# Altium footprint library ADNB95C.PcbLib: 249 footprints (part 10 of 16)
Each footprint in its own frame and in the unit in brackets; x right, y up, seen from the top. Pads: shape width x height; smd on the part's side, far side on the other; paste and mask are expansions set on the pad; w line width, h text height; cw(c..) or ccw(c..) is an arc to the next point about the centre after c.
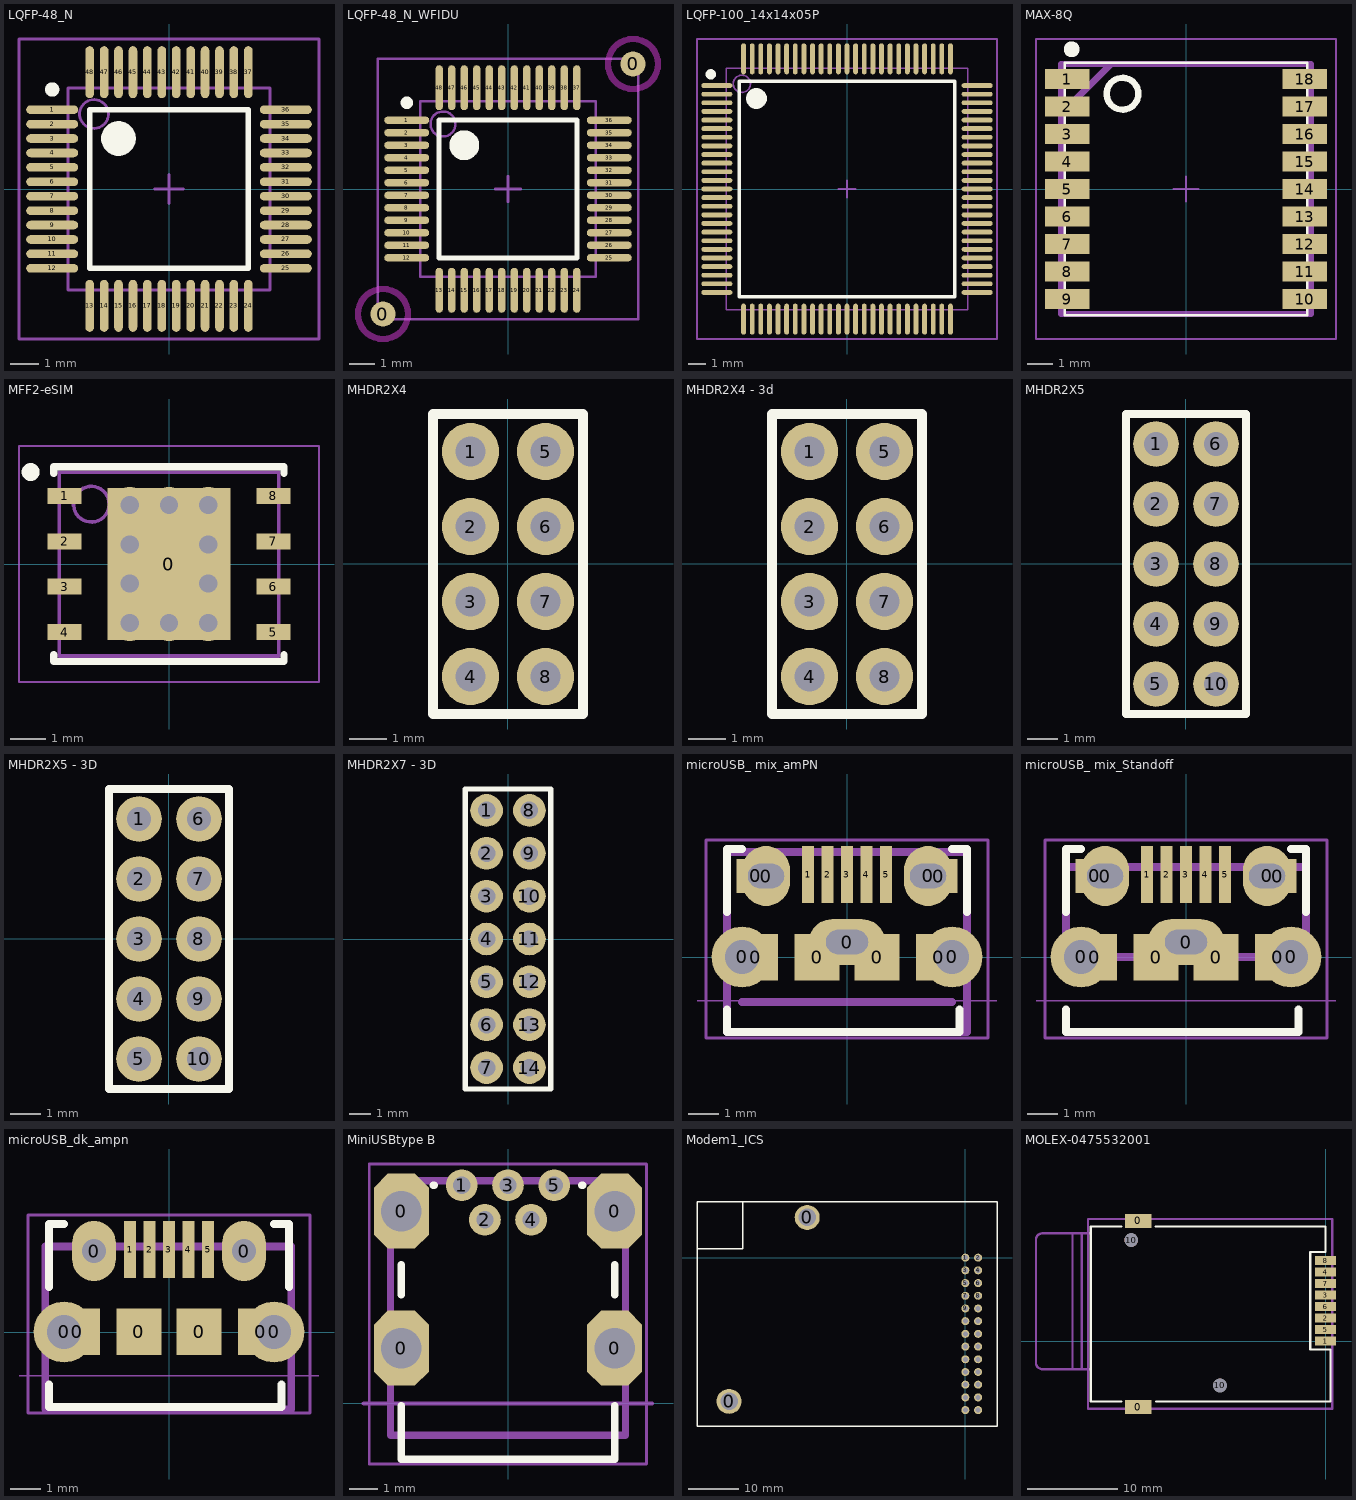
[diagram p9: the footprints below, top view; thin cyan lines are the x and y axes]

## LQFP-48_N [mm] "Thin QFP, 48-Leads, Body 7x7mm, Pitch 0.5mm, IPC Medium Density"
height 1.6
pads (48):
  oval 1.8x0.3 smd: 1(-4.05,2.75) 2(-4.05,2.25) 3(-4.05,1.75) 4(-4.05,1.25) 5(-4.05,0.75) 6(-4.05,0.25) 7(-4.05,-0.25) 8(-4.05,-0.75) 9(-4.05,-1.25) 10(-4.05,-1.75) 11(-4.05,-2.25) 12(-4.05,-2.75) 25(4.05,-2.75) 26(4.05,-2.25) 27(4.05,-1.75) 28(4.05,-1.25) 29(4.05,-0.75) 30(4.05,-0.25) 31(4.05,0.25) 32(4.05,0.75) 33(4.05,1.25) 34(4.05,1.75) 35(4.05,2.25) 36(4.05,2.75)
  oval 0.3x1.8 smd: 13(-2.75,-4.05) 14(-2.25,-4.05) 15(-1.75,-4.05) 16(-1.25,-4.05) 17(-0.75,-4.05) 18(-0.25,-4.05) 19(0.25,-4.05) 20(0.75,-4.05) 21(1.25,-4.05) 22(1.75,-4.05) 23(2.25,-4.05) 24(2.75,-4.05) 37(2.75,4.05) 38(2.25,4.05) 39(1.75,4.05) 40(1.25,4.05) 41(0.75,4.05) 42(0.25,4.05) 43(-0.25,4.05) 44(-0.75,4.05) 45(-1.25,4.05) 46(-1.75,4.05) 47(-2.25,4.05) 48(-2.75,4.05)
Top Overlay:
  circle w0.6: c-1.75,1.75 r0.3
  circle w0.25: c-4.05,3.45 r0.125
  lines w0.2: -2.75,-2.75 2.75,-2.75 2.75,2.75 -2.75,2.75 -2.75,-2.75
Top Designator (Mech7):
  text ".Designator" at -7.618,-0.508 h1.52
Top Assembly:
  circle w0.1: c-2.6,2.6 r0.5
  lines w0.1: -3.5,-3.5 3.5,-3.5 3.5,3.5 -3.5,3.5 -3.5,-3.5
Top Courtyard:
  lines w0.1: -0.5,0 0.5,0 ; 0,-0.5 0,0.5 ; -5.2,-5.2 5.2,-5.2 5.2,5.2 -5.2,5.2 -5.2,-5.2
3D body "SW3dPS-P-LQFP48-7x7-0.50.STEP": height 1.46, standoff 0.01, extent -4.5,-4.5 4.5,4.5

## LQFP-48_N_WFIDU [mm] "Thin QFP, 48-Leads, Body 7x7mm, Pitch 0.5mm, IPC Medium Density"
height 1.6
pads (50):
  round 1 smd paste-10 mask+0.5: 0(-5,-5) 0(5,5)
  oval 1.8x0.3 smd: 1(-4.05,2.75) 2(-4.05,2.25) 3(-4.05,1.75) 4(-4.05,1.25) 5(-4.05,0.75) 6(-4.05,0.25) 7(-4.05,-0.25) 8(-4.05,-0.75) 9(-4.05,-1.25) 10(-4.05,-1.75) 11(-4.05,-2.25) 12(-4.05,-2.75) 25(4.05,-2.75) 26(4.05,-2.25) 27(4.05,-1.75) 28(4.05,-1.25) 29(4.05,-0.75) 30(4.05,-0.25) 31(4.05,0.25) 32(4.05,0.75) 33(4.05,1.25) 34(4.05,1.75) 35(4.05,2.25) 36(4.05,2.75)
  oval 0.3x1.8 smd: 13(-2.75,-4.05) 14(-2.25,-4.05) 15(-1.75,-4.05) 16(-1.25,-4.05) 17(-0.75,-4.05) 18(-0.25,-4.05) 19(0.25,-4.05) 20(0.75,-4.05) 21(1.25,-4.05) 22(1.75,-4.05) 23(2.25,-4.05) 24(2.75,-4.05) 37(2.75,4.05) 38(2.25,4.05) 39(1.75,4.05) 40(1.25,4.05) 41(0.75,4.05) 42(0.25,4.05) 43(-0.25,4.05) 44(-0.75,4.05) 45(-1.25,4.05) 46(-1.75,4.05) 47(-2.25,4.05) 48(-2.75,4.05)
Top Layer keep-out:
  lines w0.254: -4,-5 ccw(c-5,-5) -4,-5 ; 6,5 ccw(c5,5) 6,5
Top Overlay:
  circle w0.6: c-1.75,1.75 r0.3
  circle w0.25: c-4.05,3.45 r0.125
  lines w0.2: -2.75,-2.75 2.75,-2.75 2.75,2.75 -2.75,2.75 -2.75,-2.75
Top Designator (Mech7):
  text ".Designator" at -7.618,-0.508 h1.52
Top Assembly:
  circle w0.1: c-2.6,2.6 r0.5
  lines w0.1: -3.5,-3.5 3.5,-3.5 3.5,3.5 -3.5,3.5 -3.5,-3.5
Top Courtyard:
  lines w0.1: -0.5,0 0.5,0 ; 0,-0.5 0,0.5 ; -5.2,-5.2 5.2,-5.2 5.2,5.2 -5.2,5.2 -5.2,-5.2
3D body "SW3dPS-P-LQFP48-7x7-0.50.STEP": height 1.46, standoff 0.01, extent -4.5,-4.5 4.5,4.5

## LQFP-100_14x14x05P [mm]
pads (100):
  oval 1.8x0.28 smd mask+0.051: 1(-7.55,6) 2(-7.55,5.5) 3(-7.55,5) 4(-7.55,4.5) 5(-7.55,4) 6(-7.55,3.5) 7(-7.55,3) 8(-7.55,2.5) 9(-7.55,2) 10(-7.55,1.5) 11(-7.55,1) 12(-7.55,0.5) 13(-7.55,0) 14(-7.55,-0.5) 15(-7.55,-1) 16(-7.55,-1.5) 17(-7.55,-2) 18(-7.55,-2.5) 19(-7.55,-3) 20(-7.55,-3.5) 21(-7.55,-4) 22(-7.55,-4.5) 23(-7.55,-5) 24(-7.55,-5.5) 25(-7.55,-6) 51(7.55,-6) 52(7.55,-5.5) 53(7.55,-5) 54(7.55,-4.5) 55(7.55,-4) 56(7.55,-3.5) 57(7.55,-3) 58(7.55,-2.5) 59(7.55,-2) 60(7.55,-1.5) 61(7.55,-1) 62(7.55,-0.5) 63(7.55,0) 64(7.55,0.5) 65(7.55,1) 66(7.55,1.5) 67(7.55,2) 68(7.55,2.5) 69(7.55,3) 70(7.55,3.5) 71(7.55,4) 72(7.55,4.5) 73(7.55,5) 74(7.55,5.5) 75(7.55,6)
  oval 0.28x1.8 smd mask+0.051: 26(-6,-7.55) 27(-5.5,-7.55) 28(-5,-7.55) 29(-4.5,-7.55) 30(-4,-7.55) 31(-3.5,-7.55) 32(-3,-7.55) 33(-2.5,-7.55) 34(-2,-7.55) 35(-1.5,-7.55) 36(-1,-7.55) 37(-0.5,-7.55) 38(0,-7.55) 39(0.5,-7.55) 40(1,-7.55) 41(1.5,-7.55) 42(2,-7.55) 43(2.5,-7.55) 44(3,-7.55) 45(3.5,-7.55) 46(4,-7.55) 47(4.5,-7.55) 48(5,-7.55) 49(5.5,-7.55) 50(6,-7.55) 76(6,7.55) 77(5.5,7.55) 78(5,7.55) 79(4.5,7.55) 80(4,7.55) 81(3.5,7.55) 82(3,7.55) 83(2.5,7.55) 84(2,7.55) 85(1.5,7.55) 86(1,7.55) 87(0.5,7.55) 88(0,7.55) 89(-0.5,7.55) 90(-1,7.55) 91(-1.5,7.55) 92(-2,7.55) 93(-2.5,7.55) 94(-3,7.55) 95(-3.5,7.55) 96(-4,7.55) 97(-4.5,7.55) 98(-5,7.55) 99(-5.5,7.55) 100(-6,7.55)
Top Overlay:
  circle w0.3: c-7.9,6.65 r0.15
  circle w0.6: c-5.25,5.25 r0.3
  lines w0.2: -6.25,-6.25 -6.25,6.25 6.25,6.25 6.25,-6.25 -6.25,-6.25
Top Designator (Mech7):
  text ".Designator" at -7.618,-0.508 h1.52
Top Assembly:
  circle w0.1: c-6.1,6.1 r0.5
  lines w0.1: -7,-7 -7,7 7,7 7,-7 -7,-7
Top Courtyard:
  lines w0.1: -0.5,0 0.5,0 ; 0,-0.5 0,0.5 ; -8.7,-8.7 8.7,-8.7 8.7,8.7 -8.7,8.7 -8.7,-8.7
3D body "LQFP-100.STEP": height 1.6, standoff 0, extent -8,-8 8,8

## MAX-8Q [mm] "MAX-8Q U-Blox GNSS"
pads (18):
  rect 1.8x0.8 smd: 1(-4.75,4.4) 2(-4.75,3.3) 3(-4.75,2.2) 4(-4.75,1.1) 5(-4.75,0) 6(-4.75,-1.1) 7(-4.75,-2.2) 8(-4.75,-3.3) 9(-4.75,-4.4) 10(4.75,-4.4) 11(4.75,-3.3) 12(4.75,-2.2) 13(4.75,-1.1) 14(4.75,0) 15(4.75,1.1) 16(4.75,2.2) 17(4.75,3.3) 18(4.75,4.4)
Top Overlay:
  circle w0.381: c-4.572,5.588 r0.127
  circle w0.254: c-2.54,3.81 r0.635
  lines w0.1: -4.85,-5.05 -4.85,5.05 4.85,5.05 4.85,-5.05 -4.85,-5.05
Top Designator (Mech7):
  text ".Designator" at -7.618,-0.508 h1.52
Top Assembly:
  lines w0.254: -5,3 -3,5 ; -5,-5 5,-5 5,5 -5,5 -5,-5
Top Courtyard:
  lines w0.1: -0.5,0 0.5,0 ; 0,-0.5 0,0.5 ; -6,-6 6,-6 6,6 -6,6 -6,-6
3D body "MAX (STEP-AP214).STEP": height 2.47, standoff 0, extent -4.85,-5.05 4.85,5.05

## MFF2-eSIM [mm] "QFN, 8-Leads, Body 6.08x5.08mm, Pitch 1.27mm, Thermal Pad 3.45x4.25mm, IPC Medium Density"
height 0.9
pads (17):
  rect 3.45x4.25 smd: 0(0,0)
  rect 0.95x0.45 smd: 1(-2.925,1.905) 2(-2.925,0.635) 3(-2.925,-0.635) 4(-2.925,-1.905) 5(2.925,-1.905) 6(2.925,-0.635) 7(2.925,0.635) 8(2.925,1.905)
  rect 0x0 smd: 9(-0.85,0) 10(-0.35,0) 11(0,0.85) 12(0,0.35) 13(0.85,0) 14(0.35,0) 15(0,-0.85) 16(0,-0.35)
via -1.1,1.65 diameter 1.016 hole 0.508
via 0,1.65 diameter 1.016 hole 0.508
via 1.1,1.65 diameter 1.016 hole 0.508
via -1.1,0.55 diameter 1.016 hole 0.508
via 1.1,0.55 diameter 1.016 hole 0.508
via -1.1,-0.55 diameter 1.016 hole 0.508
via 1.1,-0.55 diameter 1.016 hole 0.508
via -1.1,-1.65 diameter 1.016 hole 0.508
via 0,-1.65 diameter 1.016 hole 0.508
via 1.1,-1.65 diameter 1.016 hole 0.508
Top Overlay:
  circle w0.25: c-3.875,2.575 r0.125
  lines w0.2: -3.225,-2.53 -3.225,-2.725 0.01,-2.725 ; -3.225,2.53 -3.225,2.725 0.01,2.725 ; -0.01,-2.725 3.225,-2.725 3.225,-2.53 ; -0.01,2.725 3.225,2.725 3.225,2.53
Top Designator (Mech7):
  text ".Designator" at -7.618,-0.508 h1.52
Top Assembly:
  circle w0.1: c-2.175,1.675 r0.5
  lines w0.1: -3.075,-2.575 -3.075,2.575 3.075,2.575 3.075,-2.575 -3.075,-2.575
Top Courtyard:
  lines w0.05: -4.2,-3.3 -4.2,3.3 4.2,3.3 4.2,-3.3 -4.2,-3.3
  lines w0.1: -0.5,0 0.5,0 ; 0,-0.5 0,0.5
3D body "eSIM_MFF2.SLDPRT": height 1.15, standoff 0, extent -3,-3.25 3,3.25

## MHDR2X4 [mil] "HDR2X4 , 2.00mm pitch"
height 118.11
pads (8):
  round 60 hole 32: 1(-39.37,118.11) 2(-39.37,39.37) 3(-39.37,-39.37) 4(-39.37,-118.11) 5(39.37,118.11) 6(39.37,39.37) 7(39.37,-39.37) 8(39.37,-118.11)
Top Overlay:
  lines w10: -78.74,-157.48 78.74,-157.48 78.74,157.48 -78.74,157.48 -78.74,-157.48
Top Designator (Mech7):
  text ".Designator" at -299.9,-19.99 h60

## MHDR2X4 - 3d [mil] "HDR2X4 , 2.00mm pitch"
height 118.11
pads (8):
  round 60 hole 32: 1(-39.37,118.11) 2(-39.37,39.37) 3(-39.37,-39.37) 4(-39.37,-118.11) 5(39.37,118.11) 6(39.37,39.37) 7(39.37,-39.37) 8(39.37,-118.11)
Top Overlay:
  lines w10: -78.74,-157.48 -78.74,157.48 78.74,157.48 78.74,-157.48 -78.74,-157.48
Top Designator (Mech7):
  text ".Designator" at -299.9,-19.99 h60
3D body "mHDR4x2.SLDPRT": height 236.22, standoff -78.74, extent -78.74,-157.48 78.74,157.48

## MHDR2X5 [mil] "HDR2X5 , 2.00mm pitch"
height 118.11
pads (10):
  round 60 hole 32: 1(-39.37,157.48) 2(-39.37,78.74) 3(-39.37,0) 4(-39.37,-78.74) 5(-39.37,-157.48) 6(39.37,157.48) 7(39.37,78.74) 8(39.37,0) 9(39.37,-78.74) 10(39.37,-157.48)
Top Overlay:
  lines w10: -78.74,-196.85 -78.74,196.85 78.74,196.85 78.74,-196.85 -78.74,-196.85
Top Designator (Mech7):
  text ".Designator" at -299.9,-19.99 h60

## MHDR2X5 - 3D [mil] "HDR2X5 , 2.00mm pitch"
height 118.11
pads (10):
  round 60 hole 32: 1(-39.37,157.48) 2(-39.37,78.74) 3(-39.37,0) 4(-39.37,-78.74) 5(-39.37,-157.48) 6(39.37,157.48) 7(39.37,78.74) 8(39.37,0) 9(39.37,-78.74) 10(39.37,-157.48)
Top Overlay:
  lines w10: -78.74,-196.85 -78.74,196.85 78.74,196.85 78.74,-196.85 -78.74,-196.85
Top Designator (Mech7):
  text ".Designator" at -299.9,-19.99 h60
3D body "MHDR2x5.STEP": height 236.22, standoff -110.24, extent -78.74,-196.85 78.74,196.85

## MHDR2X7 - 3D [mil] "HDR2X7 , 2.00mm pitch"
height 236.22
pads (14):
  round 60 hole 32: 1(-39.37,236.22) 2(-39.37,157.48) 3(-39.37,78.74) 4(-39.37,0) 5(-39.37,-78.74) 6(-39.37,-157.48) 7(-39.37,-236.22) 8(39.37,236.22) 9(39.37,157.48) 10(39.37,78.74) 11(39.37,0) 12(39.37,-78.74) 13(39.37,-157.48) 14(39.37,-236.22)
Top Overlay:
  lines w10: -78.74,-275.59 78.74,-275.59 78.74,275.59 -78.74,275.59 -78.74,-275.59
Top Designator (Mech7):
  text ".Designator" at -299.9,-19.99 h60
3D body "MHDR2x7.SLDPRT": height 236.22, standoff -110.24, extent -78.74,-275.59 78.74,275.59

## microUSB_ mix_amPN [mm]
height 2.5
pads (16):
  round 2.032 hole 1.118: 0(-3.5,0) 0(3.5,0)
  rect 1.5x1.55 smd: 0(-3.05,0) 0(-1,0) 0(1,0) 0(3.05,0)
  rect 1.27x1.143 smd: 0(-3.05,2.7) 0(3.05,2.7)
  oval 1.6x2 hole 0.813 slot 1.2 at 0 deg: 0(-2.7,2.7) 0(2.7,2.7)
  oval 2.54x1.524 hole 0.813 slot 1.4 at 0 deg: 0(0,0.5)
  rect 0.4x1.9 smd: 1(-1.3,2.75) 2(-0.65,2.75) 3(0,2.75) 4(0.65,2.75) 5(1.3,2.75)
Top Overlay:
  lines w0.254: -4,-1.75 -4,-2.5 3.75,-2.5 3.75,-1.75 ; -4,1.5 -4,3.6 -3.5,3.6 ; 3.5,3.6 4,3.6 4,1.5
Top Designator (Mech7):
  text ".Designator" at -7.618,-0.508 h1.52
Top Assembly:
  lines w0.254: -3.5,-1.5 3.5,-1.5 ; -4,-2.5 4,-2.5 4,3.5 -4,3.5 -4,-2.5
Top Courtyard:
  lines w0.05: -5,-1.45 5,-1.45
  lines w0.1: -4.7,-2.7 4.7,-2.7 4.7,3.9 -4.7,3.9 -4.7,-2.7
  text "BOARD EDGE" at -2.5,-2.25 h0.5
3D body "User Library-MicroUSB-B_Molex_105017-0001.STEP": height 2.68, standoff -0.63, extent -4.1,-2.58 4.1,2.85

## microUSB_ mix_Standoff [mm]
height 2.5
pads (16):
  round 2.032 hole 1.118: 0(-3.5,0) 0(3.5,0)
  rect 1.5x1.55 smd: 0(-3.05,0) 0(-1,0) 0(1,0) 0(3.05,0)
  rect 1.27x1.143 smd: 0(-3.05,2.7) 0(3.05,2.7)
  oval 1.6x2 hole 0.813 slot 1.2 at 0 deg: 0(-2.7,2.7) 0(2.7,2.7)
  oval 2.54x1.524 hole 0.813 slot 1.4 at 0 deg: 0(0,0.5)
  rect 0.4x1.9 smd: 1(-1.3,2.75) 2(-0.65,2.75) 3(0,2.75) 4(0.65,2.75) 5(1.3,2.75)
Top Overlay:
  lines w0.254: -4,-1.75 -4,-2.5 3.75,-2.5 3.75,-1.75 ; -4,1.5 -4,3.6 -3.5,3.6 ; 3.5,3.6 4,3.6 4,1.5
Top Designator (Mech7):
  text ".Designator" at -7.618,-0.508 h1.52
Top Assembly:
  lines w0.254: -4,0 -4,3 4,3 4,0 -4,0
Top Courtyard:
  lines w0.05: -5,-1.45 5,-1.45
  lines w0.1: -4.7,-2.7 -4.7,3.9 4.7,3.9 4.7,-2.7 -4.7,-2.7
  text "BOARD EDGE" at -2.5,-2.25 h0.5
3D body "User Library-Micro USB B 1051330011.SLDPRT": height 6.69, standoff -2.32, extent -4.025,0.118 3.975,3.133

## microUSB_dk_ampn [mm]
height 2.5
pads (13):
  round 2.032 hole 1.118: 0(-3.5,0) 0(3.5,0)
  rect 1.5x1.55 smd: 0(-3.05,0) 0(-1,0) 0(1,0) 0(3.05,0)
  oval 1.46x2 hole 0.813: 0(-2.5,2.7) 0(2.5,2.7)
  rect 0.4x1.9 smd: 1(-1.3,2.75) 2(-0.65,2.75) 3(0,2.75) 4(0.65,2.75) 5(1.3,2.75)
Top Overlay:
  lines w0.254: -4,-1.75 -4,-2.5 3.75,-2.5 3.75,-1.75 ; -4,1.5 -4,3.6 -3.5,3.6 ; 3.5,3.6 4,3.6 4,1.5
Top Designator (Mech7):
  text ".Designator" at -7.618,-0.508 h1.52
Top Assembly:
  lines w0.254: -4.125,-2.58 4.075,-2.58 4.075,2.85 -4.125,2.85 -4.125,-2.58
Top Courtyard:
  lines w0.05: -5,-1.45 5,-1.45
  lines w0.1: -4.7,-2.7 -4.7,3.9 4.7,3.9 4.7,-2.7 -4.7,-2.7
  text "BOARD EDGE" at -2.5,-2.25 h0.5
3D body "User Library-MicroUSB-B_Molex_105017-0001.STEP": height 2.68, standoff -0.63, extent -4.125,-2.58 4.075,2.85

## MiniUSBtype B [mm]
pads (9):
  oct 1.908x2.6 hole 1.4: 0(-3.7,1.915) 0(-3.7,6.665) 0(3.7,1.915) 0(3.7,6.665)
  round 1.1 hole 0.6: 1(-1.6,7.565) 2(-0.8,6.365) 3(0,7.565) 4(0.8,6.365) 5(1.6,7.565)
Top Overlay:
  lines w0.254: -3.7,-0.08 -3.7,-1.935 3.7,-1.935 3.7,-0.08 ; -3.7,3.77 -3.7,4.81 ; -2.6,7.565 -2.56,7.565 ; 2.56,7.565 2.6,7.565 ; 3.7,3.77 3.7,4.81
Top Designator (Mech7):
  text ".Designator" at -7.618,2.492 h1.52
Top Assembly:
  lines w0.254: -4.075,-1.1 -4.075,7.725 4.075,7.725 4.075,-1.1 -4.075,-1.1
Top Courtyard:
  lines w0.1: -4.81,-2.1 -4.81,8.3 ; -4.8,-2.1 4.8,-2.1 4.8,8.3 -4.8,8.3
  lines w0.15: -5,0 4.99,0
  text "pcb edge" at -3.55,-1.55 h0.9
3D body "71071440.stp": height 3.91, standoff -2.59, extent -4.075,-1.1 4.075,7.725

## Modem1_ICS [mm] "first modem design footprint"
height 11
pads (28):
  round 5 hole 3.5: 0(-47.256,-28.732) 0(-31.625,8.055)
  round 1.6 hole 1: 1(0,0) 2(2.54,0) 3(0,-2.54) 4(2.54,-2.54) 5(0,-5.08) 6(2.54,-5.08) 7(0,-7.62) 8(2.54,-7.62) 9(0,-10.16) 10(2.54,-10.16) 11(0,-12.7) 12(2.54,-12.7) 13(0,-15.24) 14(2.54,-15.24) 15(0,-17.78) 16(2.54,-17.78) 17(0,-20.32) 18(2.54,-20.32) 19(0,-22.86) 20(2.54,-22.86) 21(0,-25.4) 22(2.54,-25.4) 23(0,-27.94) 24(2.54,-27.94) 25(0,-30.48) 26(2.54,-30.48)
Top Overlay:
  lines w0.254: -53.67,1.825 -44.5,1.825 -44.5,11.227 ; -53.67,-33.757 -53.67,11.227 6.325,11.227 6.325,-33.757 -53.67,-33.757
Top Designator (Mech7):
  text ".Designator" at -29.976,-11.72 h1.52
3D body "HDR2x13M.SLDPRT": height 8.54, standoff -2.96, extent -1.27,-31.75 3.81,1.27

## MOLEX-0475532001 [mm] "Push-push SIM Socket"
height 1.8
pads (12):
  rect 2.95x1.5 smd: 0(-20.7,-7.29) 0(-20.7,13.26)
  rect 2.3x1 smd: 1(0,0) 2(0,2.54) 3(0,5.08) 4(0,7.62) 5(0,1.27) 6(0,3.81) 7(0,6.35) 8(0,8.89)
  round 1.5 hole 1.524 unplated: 10(-21.47,11.15) 10(-11.67,-4.9)
Top Overlay:
  lines w0.254: -22.575,-6.69 -25.95,-6.69 -25.95,12.66 -22.575,12.66 ; -18.8,12.66 0,12.66 0,9.835 -1.7,9.835 ; -18.725,-6.69 0.55,-6.69 0.55,-0.94 -1.7,-0.94 -1.7,9.735
Top Designator (Mech7):
  text ".Designator" at -23.118,2.492 h1.52
Top Assembly:
  lines w0.254: -26.25,-7.475 -26.25,13.475 0.75,13.475 0.75,-7.475 -26.25,-7.475
Top Courtyard:
  lines w0.254: -27.95,-3.11 -27.95,11.89 ; -26.95,-3.11 -26.95,11.89 ; -25.955,-3.11 -31.275,-3.11 cw(c-31.285,-2.405) -31.99,-2.415 -31.99,1.22 ; -25.955,11.89 -31.3,11.89 ccw(c-31.292,11.193) -31.99,11.185 -31.99,1.22 ; -31.99,1.22 -31.99,1.22
3D body "sim_tray.SLDPRT": height 1.8, standoff 0, extent -26.25,-7.475 0.75,13.475